# Altium footprint library ICs And Semiconductors SMD.PcbLib: 943 footprints (part 6 of 60)
Each footprint in its own frame and in the unit in brackets; x right, y up, seen from the top. Pads: shape width x height; smd on the part's side, far side on the other; paste and mask are expansions set on the pad; w line width, h text height; cw(c..) or ccw(c..) is an arc to the next point about the centre after c.
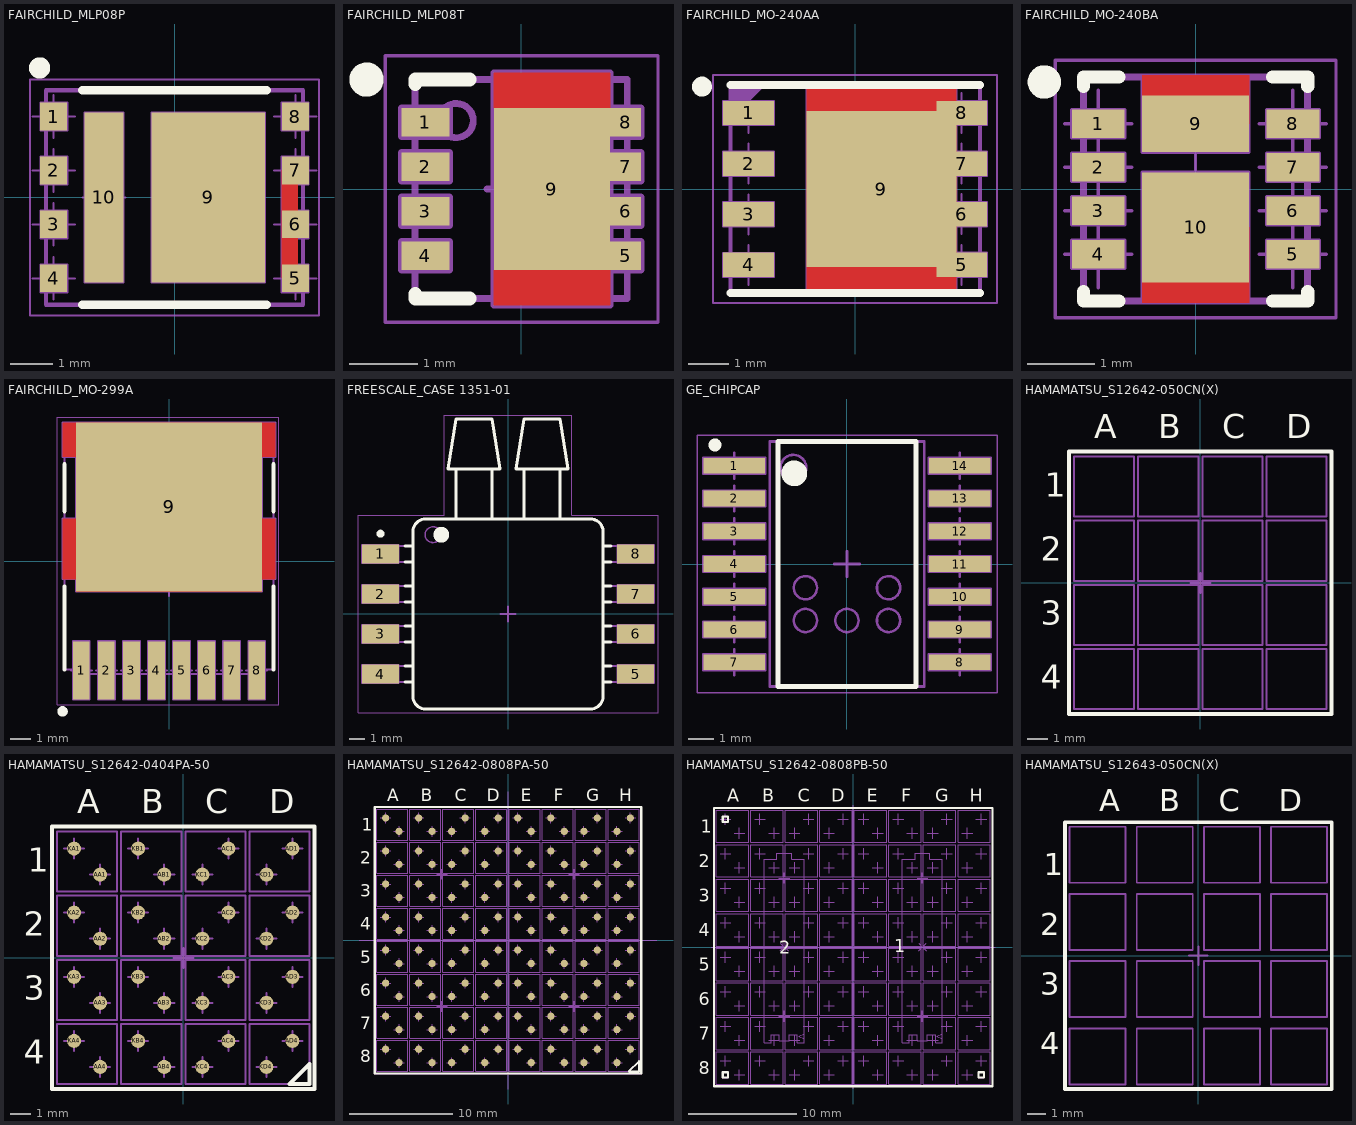
[diagram p5: the footprints below, top view; thin cyan lines are the x and y axes]

## FAIRCHILD_MLP08P [mm] "SON, 1.27mm Pitch; 8 Pin, 6.00mm W X 5.00mm L X 0.8mm H body, 2x Thermal Pad, IPC Medium Density"
height 0.8
pads (10):
  rect 0.63x0.65 smd: 1(-2.845,1.905) 2(-2.845,0.635) 3(-2.845,-0.635) 4(-2.845,-1.905) 5(2.845,-1.905) 6(2.845,-0.635) 7(2.845,0.635) 8(2.845,1.905)
  rect 2.67x4 smd paste-0.35: 9(0.795,0)
  rect 0.92x4 smd paste-0.35: 10(-1.66,0)
Top Layer:
  region: 2.52,0.635 2.9,0.635 2.9,-1.905 2.52,-1.905
Top Overlay:
  circle w0.25: c-3.175,3.048 r0.125
  lines w0.2: -2.17,-2.525 2.17,-2.525 ; -2.17,2.525 2.17,2.525
Mechanical 8:
  lines w0.05: -3.345,-1.905 -2.845,-1.905 ; -3.345,-0.635 -2.845,-0.635 ; -3.345,0.635 -2.845,0.635 ; -3.345,1.905 -2.845,1.905 ; -2.845,-2.405 -2.845,-1.905 ; -2.845,-1.405 -2.845,-1.905 ; -2.845,-1.135 -2.845,-0.635 ; -2.845,-0.135 -2.845,-0.635 ; -2.845,0.135 -2.845,0.635 ; -2.845,1.135 -2.845,0.635 ; -2.845,1.405 -2.845,1.905 ; -2.845,2.405 -2.845,1.905 ; -2.345,-1.905 -2.845,-1.905 ; -2.345,-0.635 -2.845,-0.635 ; -2.345,0.635 -2.845,0.635 ; -2.345,1.905 -2.845,1.905 ; -2.16,0 -1.66,0 ; -1.66,-0.5 -1.66,0 ; -1.66,0.5 -1.66,0 ; -1.16,0 -1.66,0 ; -0.5,0 0,0 ; 0,-0.5 0,0 ; 0,0.5 0,0 ; 0.295,0 0.795,0 ; 0.5,0 0,0 ; 0.795,-0.5 0.795,0 ; 0.795,0.5 0.795,0 ; 1.295,0 0.795,0 ; 2.345,-1.905 2.845,-1.905 ; 2.345,-0.635 2.845,-0.635 ; 2.345,0.635 2.845,0.635 ; 2.345,1.905 2.845,1.905 ; 2.52,-1.58 3.15,-1.58 3.15,-2.23 2.52,-2.23 2.52,0.96 3.15,0.96 3.15,0.31 ; 2.52,-0.96 3.15,-0.96 3.15,-0.31 2.52,-0.31 ; 2.52,0.31 3.15,0.31 ; 2.845,-2.405 2.845,-1.905 ; 2.845,-1.405 2.845,-1.905 ; 2.845,-1.135 2.845,-0.635 ; 2.845,-0.135 2.845,-0.635 ; 2.845,0.135 2.845,0.635 ; 2.845,1.135 2.845,0.635 ; 2.845,1.405 2.845,1.905 ; 2.845,2.405 2.845,1.905 ; 2.9,0.31 3.15,0.31 ; 3.345,-1.905 2.845,-1.905 ; 3.345,-0.635 2.845,-0.635 ; 3.345,0.635 2.845,0.635 ; 3.345,1.905 2.845,1.905 ; -3.15,-2.23 -3.15,-1.58 -2.52,-1.58 -2.52,-2.23 -3.15,-2.23 ; -3.15,-0.96 -3.15,-0.31 -2.52,-0.31 -2.52,-0.96 -3.15,-0.96 ; -3.15,0.31 -3.15,0.96 -2.52,0.96 -2.52,0.31 -3.15,0.31 ; -3.15,1.58 -3.15,2.23 -2.52,2.23 -2.52,1.58 -3.15,1.58 ; -2.12,-2 -2.12,2 -1.2,2 -1.2,-2 -2.12,-2 ; -0.54,-2 2.13,-2 2.13,2 -0.54,2 -0.54,-2 ; 2.52,1.58 2.52,2.23 3.15,2.23 3.15,1.58 2.52,1.58
Mechanical 14:
  lines w0.1: -3.025,-2.525 -3.025,2.525 3.025,2.525 3.025,-2.525 -3.025,-2.525
Mechanical 15:
  lines w0.05: -3.4,-2.775 3.4,-2.775 3.4,2.775 -3.4,2.775 -3.4,-2.775
3D body "FAIRCHILD_MLP08P.stp": height 0.8, standoff 0, extent -2.525,-3.025 2.525,3.025

## FAIRCHILD_MLP08T [mm] "JEDEC MO-240BA, Fairchild MLP08T, 0.65mm Pitch, 8 Pin, Body 3.3mm X 3.3mm X 0.8mm, with Thermal Pad"
height 0.8
pads (9):
  rect 0.7x0.42 smd: 1(-1.4,0.975) 2(-1.4,0.325) 3(-1.4,-0.325) 4(-1.4,-0.975)
  rect 0.45x0.42 smd: 5(1.525,-0.975) 6(1.525,-0.325) 7(1.525,0.325) 8(1.525,0.975)
  rect 1.7x2.37 smd: 9(0.45,0)
Top Layer:
  region: -0.4,1.7 1.3,1.7 1.3,1.185 -0.4,1.185
  region: -0.4,-1.7 -0.4,-1.185 1.3,-1.185 1.3,-1.7
Top Overlay:
  circle w0.25: c-2.261,1.6 r0.125
  lines w0.2: -1.55,-1.535 -1.55,-1.6 -0.75,-1.6 ; -1.55,1.535 -1.55,1.6 -0.75,1.6
Mechanical 8:
  lines w0.1: -0.5,0 0,0 ; 0,-0.5 0,0 ; 0,0.5 0,0 ; 0.5,0 0,0 ; -1.75,-1.185 -1.05,-1.185 -1.05,-0.765 -1.75,-0.765 ; -1.75,-1.185 -1.75,-0.765 ; -1.75,-1.185 -1.4,-0.975 -1.75,-0.765 ; -1.75,-0.535 -1.05,-0.535 -1.05,-0.115 -1.75,-0.115 ; -1.75,-0.535 -1.75,-0.115 ; -1.75,-0.535 -1.4,-0.325 -1.75,-0.115 ; -1.75,0.115 -1.05,0.115 -1.05,0.535 -1.75,0.535 ; -1.75,0.115 -1.75,0.535 ; -1.75,0.115 -1.4,0.325 -1.75,0.535 ; -1.75,0.765 -1.05,0.765 -1.05,1.185 -1.75,1.185 ; -1.75,0.765 -1.75,1.185 ; -1.75,0.765 -1.4,0.975 -1.75,1.185 ; -0.4,-1.185 -0.4,1.185 ; -0.4,-1.185 1.3,-1.185 ; -0.4,-1.185 1.3,-1.185 ; -0.4,-1.185 -0.4,-1.7 1.3,-1.7 ; -0.4,-1.185 0.45,0 -0.4,1.185 ; -0.4,1.185 1.3,1.185 ; -0.4,1.185 -0.4,1.7 1.3,1.7 ; -0.4,1.185 1.3,1.185 ; 1.3,-1.7 1.3,-1.185 ; 1.3,-1.7 0.45,-1.442 1.3,-1.185 ; 1.3,-1.185 1.3,1.185 ; 1.3,-1.185 1.75,-1.185 ; 1.3,-1.185 1.3,-0.765 1.75,-0.765 ; 1.3,1.185 1.3,0.765 1.75,0.765 ; 1.3,1.185 1.75,1.185 ; 1.3,1.185 1.3,1.7 ; 1.3,1.185 0.45,1.442 1.3,1.7 ; 1.75,-1.185 1.75,-0.765 ; 1.75,-1.185 1.525,-0.975 1.75,-0.765 ; 1.75,-0.535 1.75,-0.115 ; 1.75,-0.535 1.3,-0.535 1.3,-0.115 1.75,-0.115 ; 1.75,-0.535 1.525,-0.325 1.75,-0.115 ; 1.75,0.115 1.75,0.535 ; 1.75,0.115 1.3,0.115 1.3,0.535 1.75,0.535 ; 1.75,0.115 1.525,0.325 1.75,0.535 ; 1.75,0.765 1.75,1.185 ; 1.75,0.765 1.525,0.975 1.75,1.185
Mechanical 14:
  circle w0.1: c-0.95,1 r0.25
  lines w0.1: -1.55,-1.135 -1.65,-1.135 -1.65,-0.815 -1.55,-0.815 ; -1.55,-0.485 -1.65,-0.485 -1.65,-0.165 -1.55,-0.165 ; -1.55,0.165 -1.65,0.165 -1.65,0.485 -1.55,0.485 ; -1.55,0.815 -1.65,0.815 -1.65,1.135 -1.55,1.135 ; -0.075,-1.6 -0.075,-1.65 0.075,-1.65 0.075,-1.6 ; -0.075,1.6 -0.075,1.65 0.075,1.65 0.075,1.6 ; 1.55,-1.135 1.65,-1.135 1.65,-0.815 1.55,-0.815 ; 1.55,-0.485 1.65,-0.485 1.65,-0.165 1.55,-0.165 ; 1.55,0.165 1.65,0.165 1.65,0.485 1.55,0.485 ; 1.55,0.815 1.65,0.815 1.65,1.135 1.55,1.135 ; -1.55,-1.6 -1.55,1.6 1.55,1.6 1.55,-1.6 -1.55,-1.6
Mechanical 15:
  lines w0.05: -1.99,-1.95 2,-1.95 2,1.95 -1.99,1.95 -1.99,-1.95
3D body "FAIRCHILD_MLP08T.stp": height 0.8, standoff 0, extent -1.65,-1.65 1.65,1.65

## FAIRCHILD_MO-240AA [mm] "JEDEC MO-240AA, Fairchild PQFN, 1.27mm pitch, 8 pin, 6.25mm X 5.2mm X 1.10mm H body (w/thermal tab 3.75 X 3.91mm)"
height 1.1
pads (9):
  rect 1.27x0.61 smd: 1(-2.67,1.905) 2(-2.67,0.635) 3(-2.67,-0.635) 4(-2.67,-1.899) 5(2.67,-1.899) 6(2.67,-0.629) 7(2.67,0.635) 8(2.67,1.905)
  rect 3.75x3.91 smd: 9(0.66,0)
Top Layer:
  region: 2.535,2.55 2.535,-2.55 -1.215,-2.55 -1.215,2.55
Top Overlay:
  circle w0.25: c-3.835,2.565 r0.125
  lines w0.2: -3.125,-2.6 3.125,-2.6 ; -3.125,2.6 3.125,2.6
Mechanical 8:
  lines w0.05: -3.17,-1.899 -2.67,-1.899 ; -3.17,-0.635 -2.67,-0.635 ; -3.17,0.635 -2.67,0.635 ; -3.17,1.905 -2.67,1.905 ; -2.67,-2.399 -2.67,-1.899 ; -2.67,-1.399 -2.67,-1.899 ; -2.67,-1.135 -2.67,-0.635 ; -2.67,-0.135 -2.67,-0.635 ; -2.67,0.135 -2.67,0.635 ; -2.67,1.135 -2.67,0.635 ; -2.67,1.405 -2.67,1.905 ; -2.67,2.405 -2.67,1.905 ; -2.17,-1.899 -2.67,-1.899 ; -2.17,-0.635 -2.67,-0.635 ; -2.17,0.635 -2.67,0.635 ; -2.17,1.905 -2.67,1.905 ; -0.5,0 0,0 ; 0,-0.5 0,0 ; 0,0.5 0,0 ; 0.16,0 0.66,0 ; 0.5,0 0,0 ; 0.66,-0.5 0.66,0 ; 0.66,0.5 0.66,0 ; 1.16,0 0.66,0 ; 2.035,1.955 2.535,1.955 ; 2.17,-1.899 2.67,-1.899 ; 2.17,-0.629 2.67,-0.629 ; 2.17,0.635 2.67,0.635 ; 2.17,1.905 2.67,1.905 ; 2.67,-2.399 2.67,-1.899 ; 2.67,-1.399 2.67,-1.899 ; 2.67,-1.129 2.67,-0.629 ; 2.67,-0.129 2.67,-0.629 ; 2.67,0.135 2.67,0.635 ; 2.67,1.135 2.67,0.635 ; 2.67,1.405 2.67,1.905 ; 2.67,2.405 2.67,1.905 ; 3.17,-1.899 2.67,-1.899 ; 3.17,-0.629 2.67,-0.629 ; 3.17,0.635 2.67,0.635 ; 3.17,1.905 2.67,1.905 ; 2.535,1.955 -1.215,1.955 -1.215,-1.955 2.535,-1.955 2.535,1.955 ; -3.305,-2.21 -2.035,-2.21 -2.035,-1.6 -3.305,-1.6 -3.305,-2.21 ; -3.305,-0.94 -2.035,-0.94 -2.035,-0.33 -3.305,-0.33 -3.305,-0.94 ; -3.305,0.33 -2.035,0.33 -2.035,0.94 -3.305,0.94 -3.305,0.33 ; -3.305,1.6 -2.035,1.6 -2.035,2.21 -3.305,2.21 -3.305,1.6 ; -1.215,-2.55 -1.215,2.55 2.535,2.55 2.535,-2.55 -1.215,-2.55 ; 2.035,-2.204 3.305,-2.204 3.305,-1.594 2.035,-1.594 2.035,-2.204 ; 2.035,-0.934 3.305,-0.934 3.305,-0.324 2.035,-0.324 2.035,-0.934 ; 2.035,0.33 2.035,0.94 3.305,0.94 3.305,0.33 2.035,0.33 ; 2.035,1.6 2.035,2.21 3.305,2.21 3.305,1.6 2.035,1.6
Mechanical 14:
  lines w0.1: -3.124,1.789 -2.324,2.589 ; -3.124,1.889 -2.424,2.589 ; -3.124,1.989 -2.524,2.589 ; -3.124,2.089 -2.624,2.589 ; -3.124,2.189 -2.724,2.589 ; -3.124,2.289 -2.824,2.589 ; -3.124,2.389 -2.924,2.589 ; -3.124,2.489 -3.024,2.589 ; -3.125,-2.6 -3.125,2.6 3.125,2.6 3.125,-2.6 -3.125,-2.6
Mechanical 15:
  lines w0.05: -3.555,-2.85 -3.555,2.85 3.555,2.85 3.555,-2.85 -3.555,-2.85
3D body "FAIRCHILD_MO-240A.stp": height 1.1, standoff 0, extent -3.125,-2.6 3.075,2.6

## FAIRCHILD_MO-240BA [mm] "JEDEC MO-240BA, Fairchild PQFN, 0.65mm pitch, 8 pin, 3.35mm X 3.35mm X 0.8mm H body, 2x Thermal Pad"
height 1.1
pads (10):
  rect 0.79x0.42 smd: 1(-1.455,0.975) 2(-1.455,0.325) 3(-1.455,-0.325) 4(-1.455,-0.975) 5(1.455,-0.975) 6(1.455,-0.325) 7(1.455,0.325) 8(1.455,0.975)
  rect 1.6x0.85 smd: 9(0,0.975)
  rect 1.6x1.65 smd: 10(0,-0.575)
Top Layer:
  region: 0.8,-0.575 0.8,-1.7 -0.8,-1.7 -0.8,-0.575
  region: 0.8,1.7 0.8,0.975 -0.8,0.975 -0.8,1.7
Top Overlay:
  circle w0.25: c-2.261,1.6 r0.125
  lines w0.2: -1.675,-1.535 -1.675,-1.675 -1.15,-1.675 ; -1.675,1.535 -1.675,1.675 -1.15,1.675 ; 1.15,-1.675 1.675,-1.675 1.675,-1.535 ; 1.15,1.675 1.675,1.675 1.675,1.535
Mechanical 8:
  lines w0.05: -1.955,-0.975 -1.455,-0.975 ; -1.955,-0.325 -1.455,-0.325 ; -1.955,0.325 -1.455,0.325 ; -1.955,0.975 -1.455,0.975 ; -1.455,-1.475 -1.455,-0.975 ; -1.455,1.475 -1.455,0.975 ; -0.955,-0.975 -1.455,-0.975 ; -0.955,-0.325 -1.455,-0.325 ; -0.955,0.325 -1.455,0.325 ; -0.955,0.975 -1.455,0.975 ; -0.5,-0.725 0,-0.725 ; -0.5,-0.575 0,-0.575 ; -0.5,0 0,0 ; -0.5,0.975 0,0.975 ; -0.5,1.125 0,1.125 ; 0,-1.225 0,-0.725 ; 0,1.625 0,1.125 ; 0.5,-0.725 0,-0.725 ; 0.5,-0.575 0,-0.575 ; 0.5,0 0,0 ; 0.5,0.975 0,0.975 ; 0.5,1.125 0,1.125 ; 0.955,-0.975 1.455,-0.975 ; 0.955,-0.325 1.455,-0.325 ; 0.955,0.325 1.455,0.325 ; 0.955,0.975 1.455,0.975 ; 1.455,-1.475 1.455,-0.975 ; 1.455,1.475 1.455,0.975 ; 1.955,-0.975 1.455,-0.975 ; 1.955,-0.325 1.455,-0.325 ; 1.955,0.325 1.455,0.325 ; 1.955,0.975 1.455,0.975 ; -1.455,-0.975 -1.455,-0.325 ; -1.455,-0.325 -1.455,0.325 ; -1.455,0.325 -1.455,0.975 ; -0.8,0.25 -0.8,-1.7 0.8,-1.7 0.8,0.25 ; -0.8,0.25 -0.8,-1.4 0.8,-1.4 0.8,0.25 ; -0.8,0.25 0.8,0.25 ; -0.8,0.55 -0.8,1.7 0.8,1.7 0.8,0.55 ; -0.8,0.55 0.8,0.55 ; -0.8,0.55 -0.8,1.4 0.8,1.4 0.8,0.55 ; 0,-0.725 0,-0.575 ; 0,-0.575 0,0 ; 0,0 0,0.975 ; 0,0.975 0,1.125 ; 1.455,-0.975 1.455,-0.325 ; 1.455,-0.325 1.455,0.325 ; 1.455,0.325 1.455,0.975 ; -1.85,-1.185 -1.85,-0.765 -1.06,-0.765 -1.06,-1.185 -1.85,-1.185 ; -1.85,-0.535 -1.85,-0.115 -1.06,-0.115 -1.06,-0.535 -1.85,-0.535 ; -1.85,0.115 -1.85,0.535 -1.06,0.535 -1.06,0.115 -1.85,0.115 ; -1.85,0.765 -1.85,1.185 -1.06,1.185 -1.06,0.765 -1.85,0.765 ; 1.06,-1.185 1.85,-1.185 1.85,-0.765 1.06,-0.765 1.06,-1.185 ; 1.06,-0.535 1.85,-0.535 1.85,-0.115 1.06,-0.115 1.06,-0.535 ; 1.06,0.115 1.85,0.115 1.85,0.535 1.06,0.535 1.06,0.115 ; 1.06,0.765 1.85,0.765 1.85,1.185 1.06,1.185 1.06,0.765
Mechanical 14:
  lines w0.1: -1.675,-1.675 -1.675,1.675 1.675,1.675 1.675,-1.675 -1.675,-1.675
Mechanical 15:
  lines w0.05: -2.1,-1.925 -2.1,1.925 2.1,1.925 2.1,-1.925 -2.1,-1.925
3D body "FAIRCHILD_MO-240BA.stp": height 0.8, standoff 0, extent -1.675,-1.675 1.675,1.675

## FAIRCHILD_MO-299A [mm] "MO-299A, 1.2mm Pitch; 8 pin, 9.8mm W X 11.7mm L, IPC Medium Density"
height 2.4
pads (9):
  rect 0.8x2.8 smd: 1(-4.2,-5.24) 2(-3,-5.24) 3(-1.8,-5.24) 4(-0.6,-5.24) 5(0.6,-5.24) 6(1.8,-5.24) 7(3,-5.24) 8(4.2,-5.24)
  rect 8.9x8.1 smd: 9(0,2.6)
Top Layer:
  region: 5.1,4.99 5.1,6.64 -5.1,6.64 -5.1,4.99 -4.45,4.99 -4.45,2.04 -5.1,2.04 -5.1,-0.86 -4.45,-0.86 -4.45,-1.46 4.45,-1.46 4.45,-0.86 5.1,-0.86 5.1,2.04 4.45,2.04 4.45,4.99
Top Overlay:
  circle w0.25: c-5.1,-7.2 r0.125
  lines w0.2: -5,-5.2 -5,-1.21 ; -5,2.39 -5,4.64 ; 5,-5.2 5,-1.21 ; 5,2.39 5,4.64
Mechanical 8:
  lines w0.1: -4.7,-5.24 -4.2,-5.24 ; -4.2,-5.74 -4.2,-5.24 ; -4.2,-4.74 -4.2,-5.24 ; -3.7,-5.24 -4.2,-5.24 ; -3.5,-5.24 -3,-5.24 ; -3,-5.74 -3,-5.24 ; -3,-4.74 -3,-5.24 ; -2.5,-5.24 -3,-5.24 ; -2.3,-5.24 -1.8,-5.24 ; -1.8,-5.74 -1.8,-5.24 ; -1.8,-4.74 -1.8,-5.24 ; -1.3,-5.24 -1.8,-5.24 ; -1.1,-5.24 -0.6,-5.24 ; -0.6,-5.74 -0.6,-5.24 ; -0.6,-4.74 -0.6,-5.24 ; -0.5,-1.16 0,-1.16 ; -0.5,0 0,0 ; -0.5,0.59 0,0.59 ; -0.5,3.515 0,3.515 ; -0.5,5.815 0,5.815 ; -0.1,-5.24 -0.6,-5.24 ; 0,-1.66 0,-1.16 ; 0,-0.66 0,-1.16 ; 0,-0.5 0,0 ; 0,0.09 0,0.59 ; 0,0.5 0,0 ; 0,1.09 0,0.59 ; 0,3.015 0,3.515 ; 0,4.015 0,3.515 ; 0,5.315 0,5.815 ; 0,6.315 0,5.815 ; 0.1,-5.24 0.6,-5.24 ; 0.5,-1.16 0,-1.16 ; 0.5,0 0,0 ; 0.5,0.59 0,0.59 ; 0.5,3.515 0,3.515 ; 0.5,5.815 0,5.815 ; 0.6,-5.74 0.6,-5.24 ; 0.6,-4.74 0.6,-5.24 ; 1.1,-5.24 0.6,-5.24 ; 1.3,-5.24 1.8,-5.24 ; 1.8,-5.74 1.8,-5.24 ; 1.8,-4.74 1.8,-5.24 ; 2.3,-5.24 1.8,-5.24 ; 2.5,-5.24 3,-5.24 ; 3,-5.74 3,-5.24 ; 3,-4.74 3,-5.24 ; 3.5,-5.24 3,-5.24 ; 3.7,-5.24 4.2,-5.24 ; 4.2,-5.74 4.2,-5.24 ; 4.2,-4.74 4.2,-5.24 ; 4.7,-5.24 4.2,-5.24 ; -5.1,-0.86 -4.45,-0.86 -4.45,-1.46 4.45,-1.46 4.45,-0.86 5.1,-0.86 5.1,2.04 4.45,2.04 4.45,4.99 5.1,4.99 5.1,6.64 -5.1,6.64 -5.1,4.99 -4.45,4.99 -4.45,2.04 -5.1,2.04 -5.1,-0.86 ; -4.6,-6.64 -4.6,-3.84 -3.8,-3.84 -3.8,-6.64 -4.6,-6.64 ; -3.4,-6.64 -3.4,-3.84 -2.6,-3.84 -2.6,-6.64 -3.4,-6.64 ; -2.2,-6.64 -2.2,-3.84 -1.4,-3.84 -1.4,-6.64 -2.2,-6.64 ; -1,-6.64 -1,-3.84 -0.2,-3.84 -0.2,-6.64 -1,-6.64 ; 0.2,-6.64 0.2,-3.84 1,-3.84 1,-6.64 0.2,-6.64 ; 1.4,-6.64 1.4,-3.84 2.2,-3.84 2.2,-6.64 1.4,-6.64 ; 2.6,-6.64 2.6,-3.84 3.4,-3.84 3.4,-6.64 2.6,-6.64 ; 3.8,-6.64 3.8,-3.84 4.6,-3.84 4.6,-6.64 3.8,-6.64
Mechanical 14:
  lines w0.1: -5,-5.2 -5,5.9 5,5.9 5,-5.2 4.6,-5.2 4.6,-5.9 3.8,-5.9 3.8,-5.4 3.4,-5.4 3.4,-5.9 2.6,-5.9 2.6,-5.4 2.2,-5.4 2.2,-5.9 1.4,-5.9 1.4,-5.4 1,-5.4 1,-5.9 0.2,-5.9 0.2,-5.4 -0.2,-5.4 -0.2,-5.9 -1,-5.9 -1,-5.4 -1.4,-5.4 -1.4,-5.9 -2.2,-5.9 -2.2,-5.4 -2.6,-5.4 -2.6,-5.9 -3.4,-5.9 -3.4,-5.4 -3.8,-5.4 -3.8,-5.9 -4.6,-5.9 -4.6,-5.2 -5,-5.2
Mechanical 15:
  lines w0.05: -5.35,-6.89 5.25,-6.89 5.25,6.89 -5.35,6.89 -5.35,-6.89
3D body "FAIRCHILD_MO-299A.stp": height 2.4, standoff 0, extent -5,-5.9 5,5.9

## FREESCALE_CASE 1351-01 [mm] "SOIC, 2.54mm Pitch; 8 Pin, 12.065mm W X 12.065mm L X 9.906mm H Body FREESCALE Case 1351-01"
height 9.906
pads (8):
  rect 2.35x1.2 smd: 1(-8.1,3.81) 2(-8.1,1.27) 3(-8.1,-1.27) 4(-8.1,-3.81) 5(8.1,-3.81) 6(8.1,-1.27) 7(8.1,1.27) 8(8.1,3.81)
Top Overlay:
  circle w0.5: c-4.235,5.035 r0.25
  circle w0.25: c-8.1,5.1 r0.125
  lines w0.2: -6.525,-4.318 -6.035,-4.318 ; -6.525,-3.302 -6.035,-3.302 ; -6.525,-1.778 -6.035,-1.778 ; -6.525,-0.762 -6.035,-0.762 ; -6.525,0.762 -6.035,0.762 ; -6.525,1.778 -6.035,1.778 ; -6.525,3.302 -6.035,3.302 ; -6.525,4.318 -6.035,4.318 ; -3.309,6.035 -3.309,9.21 ; -1.009,6.035 -1.009,9.21 ; 1.009,6.035 1.009,9.21 ; 3.309,6.035 3.309,9.21 ; 6.035,-4.318 6.525,-4.318 ; 6.035,-3.302 6.525,-3.302 ; 6.035,-1.778 6.525,-1.778 ; 6.035,-0.762 6.525,-0.762 ; 6.035,0.762 6.525,0.762 ; 6.035,1.778 6.525,1.778 ; 6.035,3.302 6.525,3.302 ; 6.035,4.318 6.525,4.318 ; -6.035,-5.235 ccw(c-5.235,-5.235) -5.235,-6.035 5.235,-6.035 ccw(c5.235,-5.235) 6.035,-5.235 6.035,5.235 ccw(c5.235,5.235) 5.235,6.035 -5.235,6.035 ccw(c-5.235,5.235) -6.035,5.235 -6.035,-5.235 ; -3.81,9.21 -3.309,12.385 -1.009,12.385 -0.508,9.21 -3.81,9.21 ; 0.508,9.21 1.009,12.385 3.309,12.385 3.81,9.21 0.508,9.21
Mechanical 8:
  lines w0.1: -8.6,-3.81 -8.1,-3.81 ; -8.6,-1.27 -8.1,-1.27 ; -8.6,1.27 -8.1,1.27 ; -8.6,3.81 -8.1,3.81 ; -8.1,-4.31 -8.1,-3.81 ; -8.1,-3.31 -8.1,-3.81 ; -8.1,-1.77 -8.1,-1.27 ; -8.1,-0.77 -8.1,-1.27 ; -8.1,0.77 -8.1,1.27 ; -8.1,1.77 -8.1,1.27 ; -8.1,3.31 -8.1,3.81 ; -8.1,4.31 -8.1,3.81 ; -7.6,-3.81 -8.1,-3.81 ; -7.6,-1.27 -8.1,-1.27 ; -7.6,1.27 -8.1,1.27 ; -7.6,3.81 -8.1,3.81 ; -0.5,0 0,0 ; 0,-0.5 0,0 ; 0,0.5 0,0 ; 0.5,0 0,0 ; 7.6,-3.81 8.1,-3.81 ; 7.6,-1.27 8.1,-1.27 ; 7.6,1.27 8.1,1.27 ; 7.6,3.81 8.1,3.81 ; 8.1,-4.31 8.1,-3.81 ; 8.1,-3.31 8.1,-3.81 ; 8.1,-1.77 8.1,-1.27 ; 8.1,-0.77 8.1,-1.27 ; 8.1,0.77 8.1,1.27 ; 8.1,1.77 8.1,1.27 ; 8.1,3.31 8.1,3.81 ; 8.1,4.31 8.1,3.81 ; 8.6,-3.81 8.1,-3.81 ; 8.6,-1.27 8.1,-1.27 ; 8.6,1.27 8.1,1.27 ; 8.6,3.81 8.1,3.81 ; -9.275,-4.41 -6.925,-4.41 -6.925,-3.21 -9.275,-3.21 -9.275,-4.41 ; -9.275,-1.87 -6.925,-1.87 -6.925,-0.67 -9.275,-0.67 -9.275,-1.87 ; -9.275,0.67 -6.925,0.67 -6.925,1.87 -9.275,1.87 -9.275,0.67 ; -9.275,3.21 -6.925,3.21 -6.925,4.41 -9.275,4.41 -9.275,3.21 ; 6.925,-4.41 9.275,-4.41 9.275,-3.21 6.925,-3.21 6.925,-4.41 ; 6.925,-1.87 9.275,-1.87 9.275,-0.67 6.925,-0.67 6.925,-1.87 ; 6.925,0.67 9.275,0.67 9.275,1.87 6.925,1.87 6.925,0.67 ; 6.925,3.21 9.275,3.21 9.275,4.41 6.925,4.41 6.925,3.21
Mechanical 14:
  circle w0.1: c-4.76,5.035 r0.5
  lines w0.1: -6.035,-4.318 -8.793,-4.318 -8.793,-3.302 -6.035,-3.302 ; -6.035,-1.778 -8.793,-1.778 -8.793,-0.762 -6.035,-0.762 ; -6.035,0.762 -8.793,0.762 -8.793,1.778 -6.035,1.778 ; -6.035,3.302 -8.793,3.302 -8.793,4.318 -6.035,4.318 ; -3.309,6.035 -3.309,9.21 ; -1.009,6.035 -1.009,9.21 ; 1.009,6.035 1.009,9.21 ; 3.309,6.035 3.309,9.21 ; 6.035,-4.318 8.793,-4.318 8.793,-3.302 6.035,-3.302 ; 6.035,-1.778 8.793,-1.778 8.793,-0.762 6.035,-0.762 ; 6.035,0.762 8.793,0.762 8.793,1.778 6.035,1.778 ; 6.035,3.302 8.793,3.302 8.793,4.318 6.035,4.318 ; -6.035,-5.235 ccw(c-5.235,-5.235) -5.235,-6.035 5.235,-6.035 ccw(c5.235,-5.235) 6.035,-5.235 6.035,5.235 ccw(c5.235,5.235) 5.235,6.035 -5.235,6.035 ccw(c-5.235,5.235) -6.035,5.235 -6.035,-5.235 ; -3.81,9.21 -3.309,12.385 -1.009,12.385 -0.508,9.21 -3.81,9.21 ; 0.508,9.21 1.009,12.385 3.309,12.385 3.81,9.21 0.508,9.21
Mechanical 15:
  lines w0.05: -9.525,-6.285 -9.525,6.285 -4.06,6.285 -4.06,12.635 4.06,12.635 4.06,6.285 9.525,6.285 9.525,-6.285 -9.525,-6.285
3D body "FREESCALE_CASE 1351-01.stp": height 10.29, standoff -0.13, extent -8.793,-6.035 8.793,12.385

## GE_CHIPCAP [mm] "SOIC 16 ChipCap Humidity and Temperature Sensor by GE"
height 3.32
pads (14):
  rect 2.39x0.61 smd: 1(-4.37,3.81) 2(-4.37,2.54) 3(-4.37,1.27) 4(-4.37,0) 5(-4.37,-1.27) 6(-4.37,-2.54) 7(-4.37,-3.81) 8(4.37,-3.81) 9(4.37,-2.54) 10(4.37,-1.27) 11(4.37,0) 12(4.37,1.27) 13(4.37,2.54) 14(4.37,3.81)
Top Overlay:
  circle w0.5: c-2.045,3.515 r0.25
  circle w0.25: c-5.12,4.615 r0.125
  lines w0.2: -2.675,-4.75 2.675,-4.75 2.675,4.75 -2.675,4.75 -2.675,-4.75
Mechanical 8:
  circle w0.1: c0,-2.19 r0.45
  circle w0.1: c1.61,-2.19 r0.45
  circle w0.1: c-1.61,-2.19 r0.45
  circle w0.1: c1.61,-0.92 r0.45
  circle w0.1: c-1.61,-0.92 r0.45
  lines w0.1: -4.87,-3.81 -4.37,-3.81 ; -4.87,-2.54 -4.37,-2.54 ; -4.87,-1.27 -4.37,-1.27 ; -4.87,0 -4.37,0 ; -4.87,1.27 -4.37,1.27 ; -4.87,2.54 -4.37,2.54 ; -4.87,3.81 -4.37,3.81 ; -4.37,-4.31 -4.37,-3.81 ; -4.37,-3.31 -4.37,-3.81 ; -4.37,-3.04 -4.37,-2.54 ; -4.37,-2.04 -4.37,-2.54 ; -4.37,-1.77 -4.37,-1.27 ; -4.37,-0.77 -4.37,-1.27 ; -4.37,-0.5 -4.37,0 ; -4.37,0.5 -4.37,0 ; -4.37,0.77 -4.37,1.27 ; -4.37,1.77 -4.37,1.27 ; -4.37,2.04 -4.37,2.54 ; -4.37,3.04 -4.37,2.54 ; -4.37,3.31 -4.37,3.81 ; -4.37,4.31 -4.37,3.81 ; -3.87,-3.81 -4.37,-3.81 ; -3.87,-2.54 -4.37,-2.54 ; -3.87,-1.27 -4.37,-1.27 ; -3.87,0 -4.37,0 ; -3.87,1.27 -4.37,1.27 ; -3.87,2.54 -4.37,2.54 ; -3.87,3.81 -4.37,3.81 ; -0.5,0 0,0 ; 0,-0.5 0,0 ; 0,0.5 0,0 ; 0.5,0 0,0 ; 3.87,-3.81 4.37,-3.81 ; 3.87,-2.54 4.37,-2.54 ; 3.87,-1.27 4.37,-1.27 ; 3.87,0 4.37,0 ; 3.87,1.27 4.37,1.27 ; 3.87,2.54 4.37,2.54 ; 3.87,3.81 4.37,3.81 ; 4.37,-4.31 4.37,-3.81 ; 4.37,-3.31 4.37,-3.81 ; 4.37,-3.04 4.37,-2.54 ; 4.37,-2.04 4.37,-2.54 ; 4.37,-1.77 4.37,-1.27 ; 4.37,-0.77 4.37,-1.27 ; 4.37,-0.5 4.37,0 ; 4.37,0.5 4.37,0 ; 4.37,0.77 4.37,1.27 ; 4.37,1.77 4.37,1.27 ; 4.37,2.04 4.37,2.54 ; 4.37,3.04 4.37,2.54 ; 4.37,3.31 4.37,3.81 ; 4.37,4.31 4.37,3.81 ; 4.87,-3.81 4.37,-3.81 ; 4.87,-2.54 4.37,-2.54 ; 4.87,-1.27 4.37,-1.27 ; 4.87,0 4.37,0 ; 4.87,1.27 4.37,1.27 ; 4.87,2.54 4.37,2.54 ; 4.87,3.81 4.37,3.81 ; -5.565,-4.115 -3.175,-4.115 -3.175,-3.505 -5.565,-3.505 -5.565,-4.115 ; -5.565,-2.845 -3.175,-2.845 -3.175,-2.235 -5.565,-2.235 -5.565,-2.845 ; -5.565,-1.575 -3.175,-1.575 -3.175,-0.965 -5.565,-0.965 -5.565,-1.575 ; -5.565,-0.305 -3.175,-0.305 -3.175,0.305 -5.565,0.305 -5.565,-0.305 ; -5.565,0.965 -3.175,0.965 -3.175,1.575 -5.565,1.575 -5.565,0.965 ; -5.565,2.235 -3.175,2.235 -3.175,2.845 -5.565,2.845 -5.565,2.235 ; -5.565,3.505 -3.175,3.505 -3.175,4.115 -5.565,4.115 -5.565,3.505 ; 3.175,-4.115 5.565,-4.115 5.565,-3.505 3.175,-3.505 3.175,-4.115 ; 3.175,-2.845 5.565,-2.845 5.565,-2.235 3.175,-2.235 3.175,-2.845 ; 3.175,-1.575 5.565,-1.575 5.565,-0.965 3.175,-0.965 3.175,-1.575 ; 3.175,-0.305 5.565,-0.305 5.565,0.305 3.175,0.305 3.175,-0.305 ; 3.175,0.965 5.565,0.965 5.565,1.575 3.175,1.575 3.175,0.965 ; 3.175,2.235 5.565,2.235 5.565,2.845 3.175,2.845 3.175,2.235 ; 3.175,3.505 5.565,3.505 5.565,4.115 3.175,4.115 3.175,3.505
Mechanical 14:
  circle w0.1: c-2.08,3.73 r0.5
  lines w0.1: -3,-4.75 3,-4.75 3,4.75 -3,4.75 -3,-4.75
Mechanical 15:
  lines w0.05: -5.815,-5 -5.815,5 5.815,5 5.815,-5 -5.815,-5
3D body "GE_CHIPCAP.stp": height 3.32, standoff 0, extent -5.155,-4.75 5.155,4.75
